# Altium footprint library ref-packages.PCBLIB: 1543 footprints (part 71 of 103)
Each footprint in its own frame and in the unit in brackets; x right, y up, seen from the top. Pads: shape width x height; smd on the part's side, far side on the other; paste and mask are expansions set on the pad; w line width, h text height; cw(c..) or ccw(c..) is an arc to the next point about the centre after c.
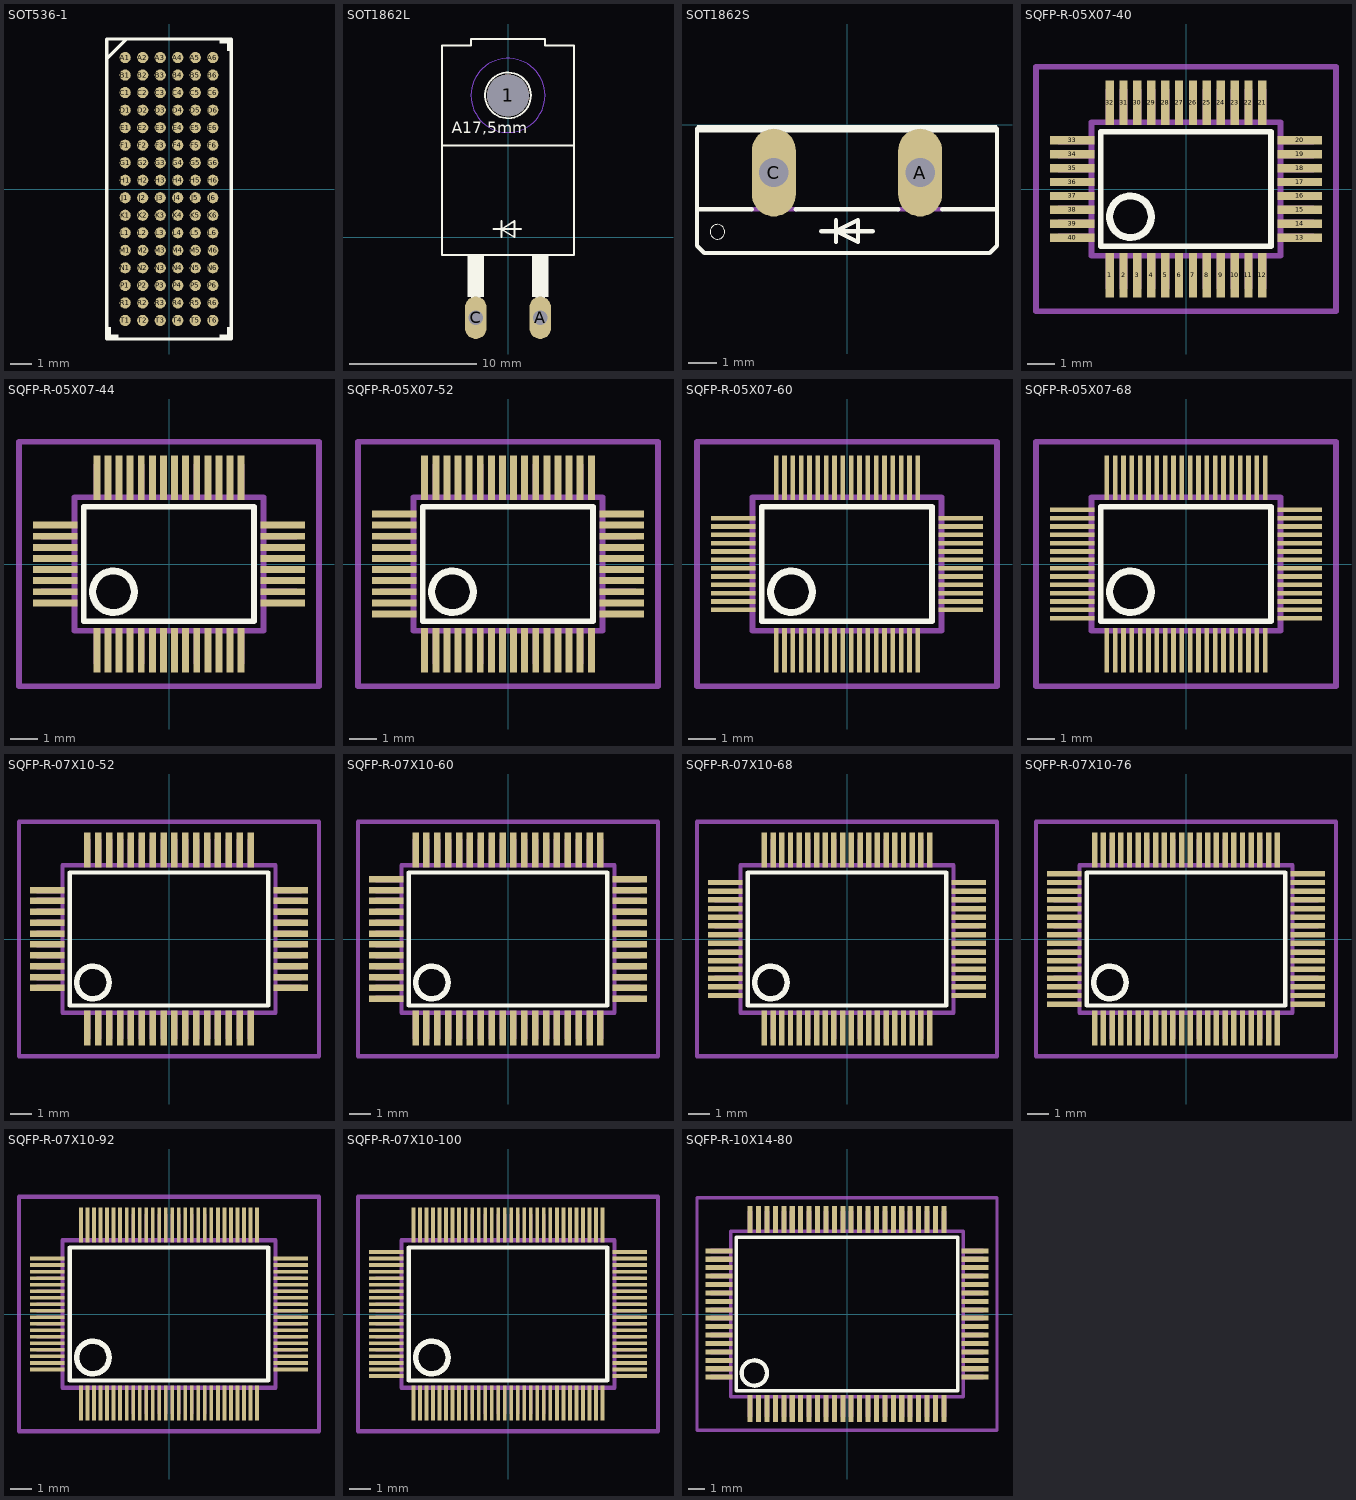
[diagram p70: the footprints below, top view; thin cyan lines are the x and y axes]

## SOT536-1 [mm]
pads (96):
  rrect100% 0.51x0.51 smd: A1(-2,6) A2(-1.2,6) A3(-0.4,6) A4(0.4,6) A5(1.2,6) A6(2,6) B1(-2,5.2) B2(-1.2,5.2) B3(-0.4,5.2) B4(0.4,5.2) B5(1.2,5.2) B6(2,5.2) C1(-2,4.4) C2(-1.2,4.4) C3(-0.4,4.4) C4(0.4,4.4) C5(1.2,4.4) C6(2,4.4) D1(-2,3.6) D2(-1.2,3.6) D3(-0.4,3.6) D4(0.4,3.6) D5(1.2,3.6) D6(2,3.6) E1(-2,2.8) E2(-1.2,2.8) E3(-0.4,2.8) E4(0.4,2.8) E5(1.2,2.8) E6(2,2.8) F1(-2,2) F2(-1.2,2) F3(-0.4,2) F4(0.4,2) F5(1.2,2) F6(2,2) G1(-2,1.2) G2(-1.2,1.2) G3(-0.4,1.2) G4(0.4,1.2) G5(1.2,1.2) G6(2,1.2) H1(-2,0.4) H2(-1.2,0.4) H3(-0.4,0.4) H4(0.4,0.4) H5(1.2,0.4) H6(2,0.4) J1(-2,-0.4) J2(-1.2,-0.4) J3(-0.4,-0.4) J4(0.4,-0.4) J5(1.2,-0.4) J6(2,-0.4) K1(-2,-1.2) K2(-1.2,-1.2) K3(-0.4,-1.2) K4(0.4,-1.2) K5(1.2,-1.2) K6(2,-1.2) L1(-2,-2) L2(-1.2,-2) L3(-0.4,-2) L4(0.4,-2) L5(1.2,-2) L6(2,-2) M1(-2,-2.8) M2(-1.2,-2.8) M3(-0.4,-2.8) M4(0.4,-2.8) M5(1.2,-2.8) M6(2,-2.8) N1(-2,-3.6) N2(-1.2,-3.6) N3(-0.4,-3.6) N4(0.4,-3.6) N5(1.2,-3.6) N6(2,-3.6) P1(-2,-4.4) P2(-1.2,-4.4) P3(-0.4,-4.4) P4(0.4,-4.4) P5(1.2,-4.4) P6(2,-4.4) R1(-2,-5.2) R2(-1.2,-5.2) R3(-0.4,-5.2) R4(0.4,-5.2) R5(1.2,-5.2) R6(2,-5.2) T1(-2,-6) T2(-1.2,-6) T3(-0.4,-6) T4(0.4,-6) T5(1.2,-6) T6(2,-6)
Top Overlay:
  rectangle: 2.3,6.65 2.8,6.8
  rectangle: 2.65,6.3 2.8,6.8
  rectangle: 2.65,-6.8 2.8,-6.3
  rectangle: 2.3,-6.8 2.8,-6.65
  rectangle: -2.8,-6.8 -2.3,-6.65
  rectangle: -2.8,-6.8 -2.65,-6.3
  lines w0.152: -2.8,6 -2,6.8 ; -2.85,-6.85 2.85,-6.85 2.85,6.85 -2.85,6.85 -2.85,-6.85

## SOT1862L [mil]
pads (3):
  round 130 hole 130: 1(0,440)
  oval 66x132 hole 44: A(100,-250) C(-100,-250)
Bottom Layer keep-out:
  circle w0: c0,440 r115
Top Overlay:
  circle w6: c0,440 r71
  rectangle: -125,-185 -75,-55
  rectangle: 75,-185 125,-55
  rectangle: 85,-190 115,-185
  rectangle: -115,-190 -85,-185
  lines w6: -45,25 -20,25 ; -20,0 -20,25 ; -20,50 -20,25 ; 40,25 -20,25 ; -205,285 -205,-55 205,-55 205,285 ; -205,285 205,285 ; -205,285 -205,595 -115,595 -115,615 115,615 115,595 205,595 205,285 ; -20,25 20,0 20,50 -20,25
  text "A17,5mm" at -175,310 h60.45
Mechanical 16:
  rectangle: 85,-255 115,-190
  rectangle: -115,-255 -85,-190
Via Holes:
  circle w0: c0,440 r115

## SOT1862S [mil]
pads (2):
  oval 60x120 hole 40: A(100,-65) C(-100,-65)
Top Overlay:
  circle w0: c-177,-146 r10
  rectangle: -205,-10 205,0
  lines w6: -205,-5 -205,-115 ; -130,-115 -205,-115 ; -70,-115 70,-115 ; -35,-145 -15,-145 ; -15,-160 -15,-145 ; -15,-130 -15,-145 ; 35,-145 -15,-145 ; 130,-115 205,-115 ; 205,-5 205,-115 ; -205,-115 -205,-165 -195,-175 195,-175 205,-165 205,-115 ; -15,-145 15,-130 15,-160 -15,-145
Mechanical 16:
  lines w6: -130,-115 -115,-115 ; -115,-5 -115,-115 ; -70,-115 -115,-115 ; 70,-115 115,-115 ; 115,-5 115,-115 ; 130,-115 115,-115

## SQFP-R-05X07-40 [mil]
pads (40):
  rect 11.81x62.99 smd: 1(-108.27,-122.05) 2(-88.58,-122.05) 3(-68.9,-122.05) 4(-49.21,-122.05) 5(-29.53,-122.05) 6(-9.84,-122.05) 7(9.84,-122.05) 8(29.53,-122.05) 9(49.21,-122.05) 10(68.9,-122.05) 11(88.58,-122.05) 12(108.27,-122.05) 21(108.27,122.05) 22(88.58,122.05) 23(68.9,122.05) 24(49.21,122.05) 25(29.53,122.05) 26(9.84,122.05) 27(-9.84,122.05) 28(-29.53,122.05) 29(-49.21,122.05) 30(-68.9,122.05) 31(-88.58,122.05) 32(-108.27,122.05)
  rect 62.99x11.81 smd: 13(161.42,-68.9) 14(161.42,-49.21) 15(161.42,-29.53) 16(161.42,-9.84) 17(161.42,9.84) 18(161.42,29.53) 19(161.42,49.21) 20(161.42,68.9) 33(-161.42,68.9) 34(-161.42,49.21) 35(-161.42,29.53) 36(-161.42,9.84) 37(-161.42,-9.84) 38(-161.42,-29.53) 39(-161.42,-49.21) 40(-161.42,-68.9)
Top Overlay:
  circle w10: c-78.74,-39.37 r29.53
  lines w8: -120.87,-81.1 120.47,-81.1 120.47,81.1 -120.87,81.1 -120.87,-81.1
Mechanical 16:
  rectangle: -114.17,-141.73 -102.36,-96.46
  rectangle: 133.86,-74.8 181.1,-62.99
  rectangle: -94.49,-141.73 -82.68,-96.46
  rectangle: -74.8,-141.73 -62.99,-96.46
  rectangle: -55.12,-141.73 -43.31,-96.46
  rectangle: -35.43,-141.73 -23.62,-96.46
  rectangle: -15.75,-141.73 -3.94,-96.46
  rectangle: 3.94,-141.73 15.75,-96.46
  rectangle: 23.62,-141.73 35.43,-96.46
  rectangle: 43.31,-141.73 55.12,-96.46
  rectangle: 62.99,-141.73 74.8,-96.46
  rectangle: 82.68,-141.73 94.49,-96.46
  rectangle: 102.36,-141.73 114.17,-96.46
  rectangle: 133.86,-55.12 181.1,-43.31
  rectangle: 133.86,-35.43 181.1,-23.62
  rectangle: 133.86,-15.75 181.1,-3.94
  rectangle: 133.86,3.94 181.1,15.75
  rectangle: 133.86,23.62 181.1,35.43
  rectangle: 133.86,43.31 181.1,55.12
  rectangle: 133.86,62.99 181.1,74.8
  rectangle: 102.36,96.46 114.17,141.73
  rectangle: 82.68,96.46 94.49,141.73
  rectangle: 62.99,96.46 74.8,141.73
  rectangle: 43.31,96.46 55.12,141.73
  rectangle: 23.62,96.46 35.43,141.73
  rectangle: 3.94,96.46 15.75,141.73
  rectangle: -15.75,96.46 -3.94,141.73
  rectangle: -35.43,96.46 -23.62,141.73
  rectangle: -55.12,96.46 -43.31,141.73
  rectangle: -74.8,96.46 -62.99,141.73
  rectangle: -94.49,96.46 -82.68,141.73
  rectangle: -114.17,96.46 -102.36,141.73
  rectangle: -181.1,62.99 -133.86,74.8
  rectangle: -181.1,43.31 -133.86,55.12
  rectangle: -181.1,23.62 -133.86,35.43
  rectangle: -181.1,3.94 -133.86,15.75
  rectangle: -181.1,-15.75 -133.86,-3.94
  rectangle: -181.1,-35.43 -133.86,-23.62
  rectangle: -181.1,-55.12 -133.86,-43.31
  rectangle: -181.1,-74.8 -133.86,-62.99
  lines w8: -133.86,-94.49 133.86,-94.49 133.86,94.49 -133.86,94.49 -133.86,-94.49
Mechanical 27:
  lines w7.87: -212.6,-173.23 -212.6,173.23 212.6,173.23 212.6,-173.23 -212.6,-173.23

## SQFP-R-05X07-44 [mm]
pads (44):
  rect 0.25x1.6 smd: 1(-2.6,-3.1) 2(-2.2,-3.1) 3(-1.8,-3.1) 4(-1.4,-3.1) 5(-1,-3.1) 6(-0.6,-3.1) 7(-0.2,-3.1) 8(0.2,-3.1) 9(0.6,-3.1) 10(1,-3.1) 11(1.4,-3.1) 12(1.8,-3.1) 13(2.2,-3.1) 14(2.6,-3.1) 23(2.6,3.1) 24(2.2,3.1) 25(1.8,3.1) 26(1.4,3.1) 27(1,3.1) 28(0.6,3.1) 29(0.2,3.1) 30(-0.2,3.1) 31(-0.6,3.1) 32(-1,3.1) 33(-1.4,3.1) 34(-1.8,3.1) 35(-2.2,3.1) 36(-2.6,3.1)
  rect 1.6x0.25 smd: 15(4.1,-1.4) 16(4.1,-1) 17(4.1,-0.6) 18(4.1,-0.2) 19(4.1,0.2) 20(4.1,0.6) 21(4.1,1) 22(4.1,1.4) 37(-4.1,1.4) 38(-4.1,1) 39(-4.1,0.6) 40(-4.1,0.2) 41(-4.1,-0.2) 42(-4.1,-0.6) 43(-4.1,-1) 44(-4.1,-1.4)
Top Overlay:
  circle w0.254: c-2,-1 r0.75
  lines w0.203: -3.07,-2.06 3.06,-2.06 3.06,2.06 -3.07,2.06 -3.07,-2.06
Mechanical 16:
  rectangle: -2.71,-3.6 -2.49,-2.45
  rectangle: 3.45,-1.51 4.6,-1.29
  rectangle: -2.31,-3.6 -2.09,-2.45
  rectangle: -1.91,-3.6 -1.69,-2.45
  rectangle: -1.51,-3.6 -1.29,-2.45
  rectangle: -1.11,-3.6 -0.89,-2.45
  rectangle: -0.71,-3.6 -0.49,-2.45
  rectangle: -0.31,-3.6 -0.09,-2.45
  rectangle: 0.09,-3.6 0.31,-2.45
  rectangle: 0.49,-3.6 0.71,-2.45
  rectangle: 0.89,-3.6 1.11,-2.45
  rectangle: 1.29,-3.6 1.51,-2.45
  rectangle: 1.69,-3.6 1.91,-2.45
  rectangle: 2.09,-3.6 2.31,-2.45
  rectangle: 2.49,-3.6 2.71,-2.45
  rectangle: 3.45,-1.11 4.6,-0.89
  rectangle: 3.45,-0.71 4.6,-0.49
  rectangle: 3.45,-0.31 4.6,-0.09
  rectangle: 3.45,0.09 4.6,0.31
  rectangle: 3.45,0.49 4.6,0.71
  rectangle: 3.45,0.89 4.6,1.11
  rectangle: 3.45,1.29 4.6,1.51
  rectangle: 2.49,2.45 2.71,3.6
  rectangle: 2.09,2.45 2.31,3.6
  rectangle: 1.69,2.45 1.91,3.6
  rectangle: 1.29,2.45 1.51,3.6
  rectangle: 0.89,2.45 1.11,3.6
  rectangle: 0.49,2.45 0.71,3.6
  rectangle: 0.09,2.45 0.31,3.6
  rectangle: -0.31,2.45 -0.09,3.6
  rectangle: -0.71,2.45 -0.49,3.6
  rectangle: -1.11,2.45 -0.89,3.6
  rectangle: -1.51,2.45 -1.29,3.6
  rectangle: -1.91,2.45 -1.69,3.6
  rectangle: -2.31,2.45 -2.09,3.6
  rectangle: -2.71,2.45 -2.49,3.6
  rectangle: -4.6,1.29 -3.45,1.51
  rectangle: -4.6,0.89 -3.45,1.11
  rectangle: -4.6,0.49 -3.45,0.71
  rectangle: -4.6,0.09 -3.45,0.31
  rectangle: -4.6,-0.31 -3.45,-0.09
  rectangle: -4.6,-0.71 -3.45,-0.49
  rectangle: -4.6,-1.11 -3.45,-0.89
  rectangle: -4.6,-1.51 -3.45,-1.29
  lines w0.203: -3.4,-2.4 3.4,-2.4 3.4,2.4 -3.4,2.4 -3.4,-2.4
Mechanical 27:
  lines w0.2: -5.4,-4.4 -5.4,4.4 5.4,4.4 5.4,-4.4 -5.4,-4.4

## SQFP-R-05X07-52 [mm]
pads (52):
  rect 0.25x1.6 smd: 1(-3,-3.1) 2(-2.6,-3.1) 3(-2.2,-3.1) 4(-1.8,-3.1) 5(-1.4,-3.1) 6(-1,-3.1) 7(-0.6,-3.1) 8(-0.2,-3.1) 9(0.2,-3.1) 10(0.6,-3.1) 11(1,-3.1) 12(1.4,-3.1) 13(1.8,-3.1) 14(2.2,-3.1) 15(2.6,-3.1) 16(3,-3.1) 27(3,3.1) 28(2.6,3.1) 29(2.2,3.1) 30(1.8,3.1) 31(1.4,3.1) 32(1,3.1) 33(0.6,3.1) 34(0.2,3.1) 35(-0.2,3.1) 36(-0.6,3.1) 37(-1,3.1) 38(-1.4,3.1) 39(-1.8,3.1) 40(-2.2,3.1) 41(-2.6,3.1) 42(-3,3.1)
  rect 1.6x0.25 smd: 17(4.1,-1.8) 18(4.1,-1.4) 19(4.1,-1) 20(4.1,-0.6) 21(4.1,-0.2) 22(4.1,0.2) 23(4.1,0.6) 24(4.1,1) 25(4.1,1.4) 26(4.1,1.8) 43(-4.1,1.8) 44(-4.1,1.4) 45(-4.1,1) 46(-4.1,0.6) 47(-4.1,0.2) 48(-4.1,-0.2) 49(-4.1,-0.6) 50(-4.1,-1) 51(-4.1,-1.4) 52(-4.1,-1.8)
Top Overlay:
  circle w0.254: c-2,-1 r0.75
  lines w0.203: -3.07,-2.06 3.06,-2.06 3.06,2.06 -3.07,2.06 -3.07,-2.06
Mechanical 16:
  rectangle: -3.11,-3.6 -2.89,-2.45
  rectangle: 3.45,-1.91 4.6,-1.69
  rectangle: -2.71,-3.6 -2.49,-2.45
  rectangle: -2.31,-3.6 -2.09,-2.45
  rectangle: -1.91,-3.6 -1.69,-2.45
  rectangle: -1.51,-3.6 -1.29,-2.45
  rectangle: -1.11,-3.6 -0.89,-2.45
  rectangle: -0.71,-3.6 -0.49,-2.45
  rectangle: -0.31,-3.6 -0.09,-2.45
  rectangle: 0.09,-3.6 0.31,-2.45
  rectangle: 0.49,-3.6 0.71,-2.45
  rectangle: 0.89,-3.6 1.11,-2.45
  rectangle: 1.29,-3.6 1.51,-2.45
  rectangle: 1.69,-3.6 1.91,-2.45
  rectangle: 2.09,-3.6 2.31,-2.45
  rectangle: 2.49,-3.6 2.71,-2.45
  rectangle: 2.89,-3.6 3.11,-2.45
  rectangle: 3.45,-1.51 4.6,-1.29
  rectangle: 3.45,-1.11 4.6,-0.89
  rectangle: 3.45,-0.71 4.6,-0.49
  rectangle: 3.45,-0.31 4.6,-0.09
  rectangle: 3.45,0.09 4.6,0.31
  rectangle: 3.45,0.49 4.6,0.71
  rectangle: 3.45,0.89 4.6,1.11
  rectangle: 3.45,1.29 4.6,1.51
  rectangle: 3.45,1.69 4.6,1.91
  rectangle: 2.89,2.45 3.11,3.6
  rectangle: 2.49,2.45 2.71,3.6
  rectangle: 2.09,2.45 2.31,3.6
  rectangle: 1.69,2.45 1.91,3.6
  rectangle: 1.29,2.45 1.51,3.6
  rectangle: 0.89,2.45 1.11,3.6
  rectangle: 0.49,2.45 0.71,3.6
  rectangle: 0.09,2.45 0.31,3.6
  rectangle: -0.31,2.45 -0.09,3.6
  rectangle: -0.71,2.45 -0.49,3.6
  rectangle: -1.11,2.45 -0.89,3.6
  rectangle: -1.51,2.45 -1.29,3.6
  rectangle: -1.91,2.45 -1.69,3.6
  rectangle: -2.31,2.45 -2.09,3.6
  rectangle: -2.71,2.45 -2.49,3.6
  rectangle: -3.11,2.45 -2.89,3.6
  rectangle: -4.6,1.69 -3.45,1.91
  rectangle: -4.6,1.29 -3.45,1.51
  rectangle: -4.6,0.89 -3.45,1.11
  rectangle: -4.6,0.49 -3.45,0.71
  rectangle: -4.6,0.09 -3.45,0.31
  rectangle: -4.6,-0.31 -3.45,-0.09
  rectangle: -4.6,-0.71 -3.45,-0.49
  rectangle: -4.6,-1.11 -3.45,-0.89
  rectangle: -4.6,-1.51 -3.45,-1.29
  rectangle: -4.6,-1.91 -3.45,-1.69
  lines w0.203: -3.4,-2.4 3.4,-2.4 3.4,2.4 -3.4,2.4 -3.4,-2.4
Mechanical 27:
  lines w0.2: -5.4,-4.4 -5.4,4.4 5.4,4.4 5.4,-4.4 -5.4,-4.4

## SQFP-R-05X07-60 [mm]
pads (60):
  rect 0.17x1.6 smd: 1(-2.55,-3.1) 2(-2.25,-3.1) 3(-1.95,-3.1) 4(-1.65,-3.1) 5(-1.35,-3.1) 6(-1.05,-3.1) 7(-0.75,-3.1) 8(-0.45,-3.1) 9(-0.15,-3.1) 10(0.15,-3.1) 11(0.45,-3.1) 12(0.75,-3.1) 13(1.05,-3.1) 14(1.35,-3.1) 15(1.65,-3.1) 16(1.95,-3.1) 17(2.25,-3.1) 18(2.55,-3.1) 31(2.55,3.1) 32(2.25,3.1) 33(1.95,3.1) 34(1.65,3.1) 35(1.35,3.1) 36(1.05,3.1) 37(0.75,3.1) 38(0.45,3.1) 39(0.15,3.1) 40(-0.15,3.1) 41(-0.45,3.1) 42(-0.75,3.1) 43(-1.05,3.1) 44(-1.35,3.1) 45(-1.65,3.1) 46(-1.95,3.1) 47(-2.25,3.1) 48(-2.55,3.1)
  rect 1.6x0.17 smd: 19(4.1,-1.65) 20(4.1,-1.35) 21(4.1,-1.05) 22(4.1,-0.75) 23(4.1,-0.45) 24(4.1,-0.15) 25(4.1,0.15) 26(4.1,0.45) 27(4.1,0.75) 28(4.1,1.05) 29(4.1,1.35) 30(4.1,1.65) 49(-4.1,1.65) 50(-4.1,1.35) 51(-4.1,1.05) 52(-4.1,0.75) 53(-4.1,0.45) 54(-4.1,0.15) 55(-4.1,-0.15) 56(-4.1,-0.45) 57(-4.1,-0.75) 58(-4.1,-1.05) 59(-4.1,-1.35) 60(-4.1,-1.65)
Top Overlay:
  circle w0.254: c-2,-1 r0.75
  lines w0.203: -3.07,-2.06 3.06,-2.06 3.06,2.06 -3.07,2.06 -3.07,-2.06
Mechanical 16:
  rectangle: -2.62,-3.6 -2.48,-2.45
  rectangle: 3.45,-1.72 4.6,-1.58
  rectangle: -2.32,-3.6 -2.18,-2.45
  rectangle: -2.02,-3.6 -1.88,-2.45
  rectangle: -1.72,-3.6 -1.58,-2.45
  rectangle: -1.42,-3.6 -1.28,-2.45
  rectangle: -1.12,-3.6 -0.98,-2.45
  rectangle: -0.82,-3.6 -0.68,-2.45
  rectangle: -0.52,-3.6 -0.38,-2.45
  rectangle: -0.22,-3.6 -0.08,-2.45
  rectangle: 0.08,-3.6 0.22,-2.45
  rectangle: 0.38,-3.6 0.52,-2.45
  rectangle: 0.68,-3.6 0.82,-2.45
  rectangle: 0.98,-3.6 1.12,-2.45
  rectangle: 1.28,-3.6 1.42,-2.45
  rectangle: 1.58,-3.6 1.72,-2.45
  rectangle: 1.88,-3.6 2.02,-2.45
  rectangle: 2.18,-3.6 2.32,-2.45
  rectangle: 2.48,-3.6 2.62,-2.45
  rectangle: 3.45,-1.42 4.6,-1.28
  rectangle: 3.45,-1.12 4.6,-0.98
  rectangle: 3.45,-0.82 4.6,-0.68
  rectangle: 3.45,-0.52 4.6,-0.38
  rectangle: 3.45,-0.22 4.6,-0.08
  rectangle: 3.45,0.08 4.6,0.22
  rectangle: 3.45,0.38 4.6,0.52
  rectangle: 3.45,0.68 4.6,0.82
  rectangle: 3.45,0.98 4.6,1.12
  rectangle: 3.45,1.28 4.6,1.42
  rectangle: 3.45,1.58 4.6,1.72
  rectangle: 2.48,2.45 2.62,3.6
  rectangle: 2.18,2.45 2.32,3.6
  rectangle: 1.88,2.45 2.02,3.6
  rectangle: 1.58,2.45 1.72,3.6
  rectangle: 1.28,2.45 1.42,3.6
  rectangle: 0.98,2.45 1.12,3.6
  rectangle: 0.68,2.45 0.82,3.6
  rectangle: 0.38,2.45 0.52,3.6
  rectangle: 0.08,2.45 0.22,3.6
  rectangle: -0.22,2.45 -0.08,3.6
  rectangle: -0.52,2.45 -0.38,3.6
  rectangle: -0.82,2.45 -0.68,3.6
  rectangle: -1.12,2.45 -0.98,3.6
  rectangle: -1.42,2.45 -1.28,3.6
  rectangle: -1.72,2.45 -1.58,3.6
  rectangle: -2.02,2.45 -1.88,3.6
  rectangle: -2.32,2.45 -2.18,3.6
  rectangle: -2.62,2.45 -2.48,3.6
  rectangle: -4.6,1.58 -3.45,1.72
  rectangle: -4.6,1.28 -3.45,1.42
  rectangle: -4.6,0.98 -3.45,1.12
  rectangle: -4.6,0.68 -3.45,0.82
  rectangle: -4.6,0.38 -3.45,0.52
  rectangle: -4.6,0.08 -3.45,0.22
  rectangle: -4.6,-0.22 -3.45,-0.08
  rectangle: -4.6,-0.52 -3.45,-0.38
  rectangle: -4.6,-0.82 -3.45,-0.68
  rectangle: -4.6,-1.12 -3.45,-0.98
  rectangle: -4.6,-1.42 -3.45,-1.28
  rectangle: -4.6,-1.72 -3.45,-1.58
  lines w0.203: -3.4,-2.4 3.4,-2.4 3.4,2.4 -3.4,2.4 -3.4,-2.4
Mechanical 27:
  lines w0.2: -5.4,-4.4 -5.4,4.4 5.4,4.4 5.4,-4.4 -5.4,-4.4

## SQFP-R-05X07-68 [mm]
pads (68):
  rect 0.17x1.6 smd: 1(-2.85,-3.1) 2(-2.55,-3.1) 3(-2.25,-3.1) 4(-1.95,-3.1) 5(-1.65,-3.1) 6(-1.35,-3.1) 7(-1.05,-3.1) 8(-0.75,-3.1) 9(-0.45,-3.1) 10(-0.15,-3.1) 11(0.15,-3.1) 12(0.45,-3.1) 13(0.75,-3.1) 14(1.05,-3.1) 15(1.35,-3.1) 16(1.65,-3.1) 17(1.95,-3.1) 18(2.25,-3.1) 19(2.55,-3.1) 20(2.85,-3.1) 35(2.85,3.1) 36(2.55,3.1) 37(2.25,3.1) 38(1.95,3.1) 39(1.65,3.1) 40(1.35,3.1) 41(1.05,3.1) 42(0.75,3.1) 43(0.45,3.1) 44(0.15,3.1) 45(-0.15,3.1) 46(-0.45,3.1) 47(-0.75,3.1) 48(-1.05,3.1) 49(-1.35,3.1) 50(-1.65,3.1) 51(-1.95,3.1) 52(-2.25,3.1) 53(-2.55,3.1) 54(-2.85,3.1)
  rect 1.6x0.17 smd: 21(4.1,-1.95) 22(4.1,-1.65) 23(4.1,-1.35) 24(4.1,-1.05) 25(4.1,-0.75) 26(4.1,-0.45) 27(4.1,-0.15) 28(4.1,0.15) 29(4.1,0.45) 30(4.1,0.75) 31(4.1,1.05) 32(4.1,1.35) 33(4.1,1.65) 34(4.1,1.95) 55(-4.1,1.95) 56(-4.1,1.65) 57(-4.1,1.35) 58(-4.1,1.05) 59(-4.1,0.75) 60(-4.1,0.45) 61(-4.1,0.15) 62(-4.1,-0.15) 63(-4.1,-0.45) 64(-4.1,-0.75) 65(-4.1,-1.05) 66(-4.1,-1.35) 67(-4.1,-1.65) 68(-4.1,-1.95)
Top Overlay:
  circle w0.254: c-2,-1 r0.75
  lines w0.203: -3.07,-2.06 3.06,-2.06 3.06,2.06 -3.07,2.06 -3.07,-2.06
Mechanical 16:
  rectangle: -2.92,-3.6 -2.78,-2.45
  rectangle: 3.45,-2.02 4.6,-1.88
  rectangle: -2.62,-3.6 -2.48,-2.45
  rectangle: -2.32,-3.6 -2.18,-2.45
  rectangle: -2.02,-3.6 -1.88,-2.45
  rectangle: -1.72,-3.6 -1.58,-2.45
  rectangle: -1.42,-3.6 -1.28,-2.45
  rectangle: -1.12,-3.6 -0.98,-2.45
  rectangle: -0.82,-3.6 -0.68,-2.45
  rectangle: -0.52,-3.6 -0.38,-2.45
  rectangle: -0.22,-3.6 -0.08,-2.45
  rectangle: 0.08,-3.6 0.22,-2.45
  rectangle: 0.38,-3.6 0.52,-2.45
  rectangle: 0.68,-3.6 0.82,-2.45
  rectangle: 0.98,-3.6 1.12,-2.45
  rectangle: 1.28,-3.6 1.42,-2.45
  rectangle: 1.58,-3.6 1.72,-2.45
  rectangle: 1.88,-3.6 2.02,-2.45
  rectangle: 2.18,-3.6 2.32,-2.45
  rectangle: 2.48,-3.6 2.62,-2.45
  rectangle: 2.78,-3.6 2.92,-2.45
  rectangle: 3.45,-1.72 4.6,-1.58
  rectangle: 3.45,-1.42 4.6,-1.28
  rectangle: 3.45,-1.12 4.6,-0.98
  rectangle: 3.45,-0.82 4.6,-0.68
  rectangle: 3.45,-0.52 4.6,-0.38
  rectangle: 3.45,-0.22 4.6,-0.08
  rectangle: 3.45,0.08 4.6,0.22
  rectangle: 3.45,0.38 4.6,0.52
  rectangle: 3.45,0.68 4.6,0.82
  rectangle: 3.45,0.98 4.6,1.12
  rectangle: 3.45,1.28 4.6,1.42
  rectangle: 3.45,1.58 4.6,1.72
  rectangle: 3.45,1.88 4.6,2.02
  rectangle: 2.78,2.45 2.92,3.6
  rectangle: 2.48,2.45 2.62,3.6
  rectangle: 2.18,2.45 2.32,3.6
  rectangle: 1.88,2.45 2.02,3.6
  rectangle: 1.58,2.45 1.72,3.6
  rectangle: 1.28,2.45 1.42,3.6
  rectangle: 0.98,2.45 1.12,3.6
  rectangle: 0.68,2.45 0.82,3.6
  rectangle: 0.38,2.45 0.52,3.6
  rectangle: 0.08,2.45 0.22,3.6
  rectangle: -0.22,2.45 -0.08,3.6
  rectangle: -0.52,2.45 -0.38,3.6
  rectangle: -0.82,2.45 -0.68,3.6
  rectangle: -1.12,2.45 -0.98,3.6
  rectangle: -1.42,2.45 -1.28,3.6
  rectangle: -1.72,2.45 -1.58,3.6
  rectangle: -2.02,2.45 -1.88,3.6
  rectangle: -2.32,2.45 -2.18,3.6
  rectangle: -2.62,2.45 -2.48,3.6
  rectangle: -2.92,2.45 -2.78,3.6
  rectangle: -4.6,1.88 -3.45,2.02
  rectangle: -4.6,1.58 -3.45,1.72
  rectangle: -4.6,1.28 -3.45,1.42
  rectangle: -4.6,0.98 -3.45,1.12
  rectangle: -4.6,0.68 -3.45,0.82
  rectangle: -4.6,0.38 -3.45,0.52
  rectangle: -4.6,0.08 -3.45,0.22
  rectangle: -4.6,-0.22 -3.45,-0.08
  rectangle: -4.6,-0.52 -3.45,-0.38
  rectangle: -4.6,-0.82 -3.45,-0.68
  rectangle: -4.6,-1.12 -3.45,-0.98
  rectangle: -4.6,-1.42 -3.45,-1.28
  rectangle: -4.6,-1.72 -3.45,-1.58
  rectangle: -4.6,-2.02 -3.45,-1.88
  lines w0.203: -3.4,-2.4 3.4,-2.4 3.4,2.4 -3.4,2.4 -3.4,-2.4
Mechanical 27:
  lines w0.2: -5.4,-4.4 -5.4,4.4 5.4,4.4 5.4,-4.4 -5.4,-4.4

## SQFP-R-07X10-52 [mil]
pads (52):
  rect 11.81x62.99 smd: 1(-147.64,-161.42) 2(-127.95,-161.42) 3(-108.27,-161.42) 4(-88.58,-161.42) 5(-68.9,-161.42) 6(-49.21,-161.42) 7(-29.53,-161.42) 8(-9.84,-161.42) 9(9.84,-161.42) 10(29.53,-161.42) 11(49.21,-161.42) 12(68.9,-161.42) 13(88.58,-161.42) 14(108.27,-161.42) 15(127.95,-161.42) 16(147.64,-161.42) 27(147.64,161.42) 28(127.95,161.42) 29(108.27,161.42) 30(88.58,161.42) 31(68.9,161.42) 32(49.21,161.42) 33(29.53,161.42) 34(9.84,161.42) 35(-9.84,161.42) 36(-29.53,161.42) 37(-49.21,161.42) 38(-68.9,161.42) 39(-88.58,161.42) 40(-108.27,161.42) 41(-127.95,161.42) 42(-147.64,161.42)
  rect 62.99x11.81 smd: 17(220.47,-88.58) 18(220.47,-68.9) 19(220.47,-49.21) 20(220.47,-29.53) 21(220.47,-9.84) 22(220.47,9.84) 23(220.47,29.53) 24(220.47,49.21) 25(220.47,68.9) 26(220.47,88.58) 43(-220.47,88.58) 44(-220.47,68.9) 45(-220.47,49.21) 46(-220.47,29.53) 47(-220.47,9.84) 48(-220.47,-9.84) 49(-220.47,-29.53) 50(-220.47,-49.21) 51(-220.47,-68.9) 52(-220.47,-88.58)
Top Overlay:
  circle w10: c-137.8,-78.74 r29.53
  lines w8: -179.92,-120.47 179.53,-120.47 179.53,120.47 -179.92,120.47 -179.92,-120.47
Mechanical 16:
  rectangle: -153.54,-181.1 -141.73,-135.83
  rectangle: 194.88,-94.49 240.16,-82.68
  rectangle: -133.86,-181.1 -122.05,-135.83
  rectangle: -114.17,-181.1 -102.36,-135.83
  rectangle: -94.49,-181.1 -82.68,-135.83
  rectangle: -74.8,-181.1 -62.99,-135.83
  rectangle: -55.12,-181.1 -43.31,-135.83
  rectangle: -35.43,-181.1 -23.62,-135.83
  rectangle: -15.75,-181.1 -3.94,-135.83
  rectangle: 3.94,-181.1 15.75,-135.83
  rectangle: 23.62,-181.1 35.43,-135.83
  rectangle: 43.31,-181.1 55.12,-135.83
  rectangle: 62.99,-181.1 74.8,-135.83
  rectangle: 82.68,-181.1 94.49,-135.83
  rectangle: 102.36,-181.1 114.17,-135.83
  rectangle: 122.05,-181.1 133.86,-135.83
  rectangle: 141.73,-181.1 153.54,-135.83
  rectangle: 194.88,-74.8 240.16,-62.99
  rectangle: 194.88,-55.12 240.16,-43.31
  rectangle: 194.88,-35.43 240.16,-23.62
  rectangle: 194.88,-15.75 240.16,-3.94
  rectangle: 194.88,3.94 240.16,15.75
  rectangle: 194.88,23.62 240.16,35.43
  rectangle: 194.88,43.31 240.16,55.12
  rectangle: 194.88,62.99 240.16,74.8
  rectangle: 194.88,82.68 240.16,94.49
  rectangle: 141.73,135.83 153.54,181.1
  rectangle: 122.05,135.83 133.86,181.1
  rectangle: 102.36,135.83 114.17,181.1
  rectangle: 82.68,135.83 94.49,181.1
  rectangle: 62.99,135.83 74.8,181.1
  rectangle: 43.31,135.83 55.12,181.1
  rectangle: 23.62,135.83 35.43,181.1
  rectangle: 3.94,135.83 15.75,181.1
  rectangle: -15.75,135.83 -3.94,181.1
  rectangle: -35.43,135.83 -23.62,181.1
  rectangle: -55.12,135.83 -43.31,181.1
  rectangle: -74.8,135.83 -62.99,181.1
  rectangle: -94.49,135.83 -82.68,181.1
  rectangle: -114.17,135.83 -102.36,181.1
  rectangle: -133.86,135.83 -122.05,181.1
  rectangle: -153.54,135.83 -141.73,181.1
  rectangle: -240.16,82.68 -194.88,94.49
  rectangle: -240.16,62.99 -194.88,74.8
  rectangle: -240.16,43.31 -194.88,55.12
  rectangle: -240.16,23.62 -194.88,35.43
  rectangle: -240.16,3.94 -194.88,15.75
  rectangle: -240.16,-15.75 -194.88,-3.94
  rectangle: -240.16,-35.43 -194.88,-23.62
  rectangle: -240.16,-55.12 -194.88,-43.31
  rectangle: -240.16,-74.8 -194.88,-62.99
  rectangle: -240.16,-94.49 -194.88,-82.68
  lines w8: -192.91,-133.86 192.91,-133.86 192.91,133.86 -192.91,133.86 -192.91,-133.86
Mechanical 27:
  lines w7.87: -271.65,-212.6 -271.65,212.6 271.65,212.6 271.65,-212.6 -271.65,-212.6
